# Altium footprint library lib_PCB.PcbLib: 392 footprints (part 18 of 25)
Each footprint in its own frame and in the unit in brackets; x right, y up, seen from the top. Pads: shape width x height; smd on the part's side, far side on the other; paste and mask are expansions set on the pad; w line width, h text height; cw(c..) or ccw(c..) is an arc to the next point about the centre after c.
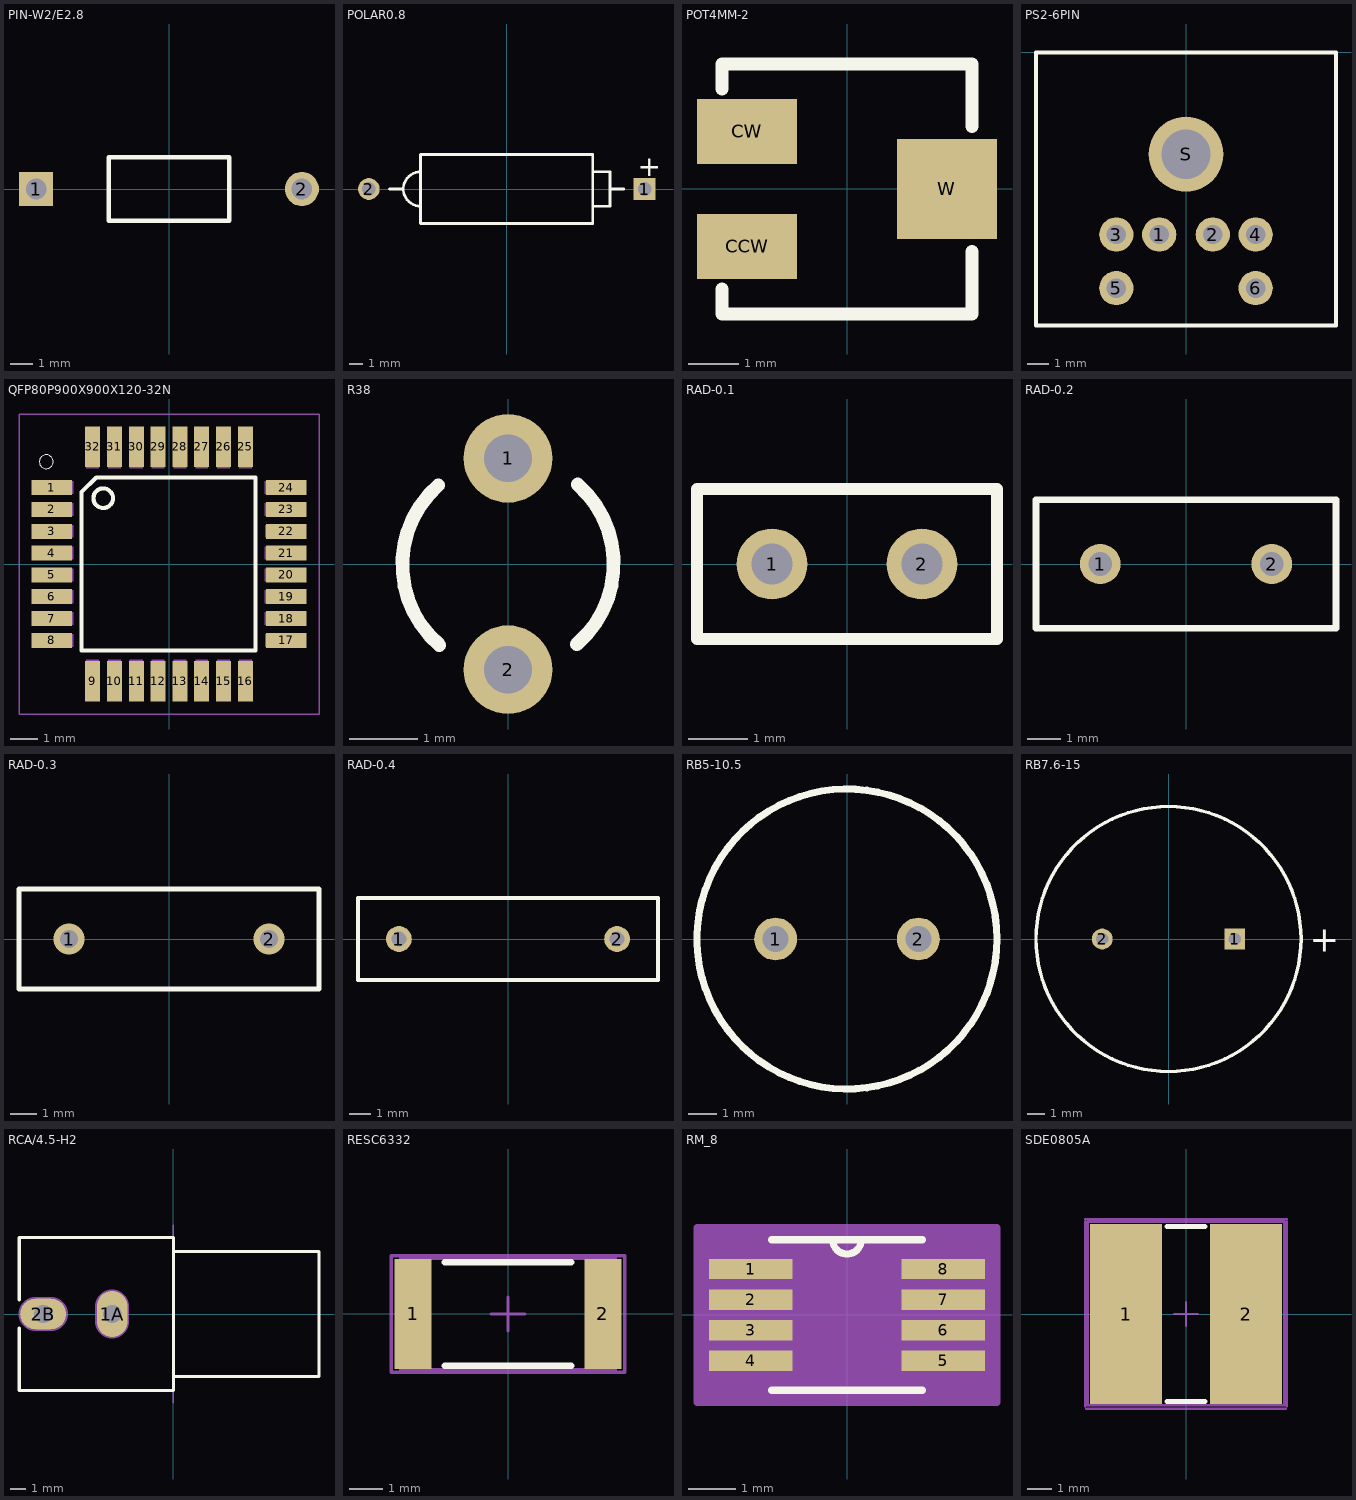
[diagram p17: the footprints below, top view; thin cyan lines are the x and y axes]

## PIN-W2/E2.8 [mm] "Thru-Hole; 2 Leads"
pads (2):
  rect 1.5x1.5 hole 0.9: 1(-5.825,0)
  round 1.5 hole 0.9: 2(5.825,0)
Top Overlay:
  lines w0.2: -2.65,-1.4 -2.65,1.4 2.65,1.4 2.65,-1.4 -2.65,-1.4

## POLAR0.8 [mm] "Polarized Capacitor; 2 Leads"
height 5.08
pads (2):
  rect 1.6x1.6 hole 1: 1(10.16,0)
  round 1.6 hole 1: 2(-10.16,0)
Top Overlay:
  lines w0.2: -8.636,0 -7.62,0 ; -6.35,-1.27 cw(c-6.35,0) -6.35,1.27 ; 6.35,-1.27 7.62,-1.27 7.62,1.27 6.35,1.27 ; 7.62,0 8.636,0 ; -6.35,-2.54 6.35,-2.54 6.35,2.54 -6.35,2.54 -6.35,-2.54
  text "+" at 9.652,0.95 h1.5

## POT4MM-2 [mm] "Square Trimming Potentiometer"
pads (3):
  rect 2x1.3 smd: CCW(-2,-1.15) CW(-2,1.15)
  rect 2x2 smd: W(2,0)
Top Overlay:
  lines w0.254: -2.5,-2 -2.5,-2.5 2.5,-2.5 2.5,-1.25 ; -2.5,2 -2.5,2.5 2.5,2.5 2.5,1.25

## PS2-6PIN [mm] "PS2 Socket, 6 Pin, Through Hole"
pads (7):
  round 1.6 hole 0.9: 1(-1.25,-8.5) 2(1.25,-8.5) 3(-3.25,-8.5) 4(3.25,-8.5) 5(-3.25,-11) 6(3.25,-11)
  round 3.5 hole 2.3: S(0,-4.75)
Top Overlay:
  lines w0.2: -7,-12.75 7,-12.75 7,0 -7,0 -7,-12.75

## QFP80P900X900X120-32N [mm]
pads (32):
  rect 1.5x0.55 smd: 1(-4.3,2.8) 2(-4.3,2) 3(-4.3,1.2) 4(-4.3,0.4) 5(-4.3,-0.4) 6(-4.3,-1.2) 7(-4.3,-2) 8(-4.3,-2.8) 17(4.3,-2.8) 18(4.3,-2) 19(4.3,-1.2) 20(4.3,-0.4) 21(4.3,0.4) 22(4.3,1.2) 23(4.3,2) 24(4.3,2.8)
  rect 0.55x1.5 smd: 9(-2.8,-4.3) 10(-2,-4.3) 11(-1.2,-4.3) 12(-0.4,-4.3) 13(0.4,-4.3) 14(1.2,-4.3) 15(2,-4.3) 16(2.8,-4.3) 25(2.8,4.3) 26(2,4.3) 27(1.2,4.3) 28(0.4,4.3) 29(-0.4,4.3) 30(-1.2,4.3) 31(-2,4.3) 32(-2.8,4.3)
Top Overlay:
  circle w0: c-4.5,3.75 r0.254
  circle w0.152: c-2.413,2.413 r0.359
  lines w0.152: -3.204,-3.175 3.175,-3.175 3.175,3.175 -2.667,3.175 -3.204,2.638 -3.204,-3.175
Mechanical 1:
  region: -3.039,4.497 -2.571,4.497 -2.571,3.518 -3.039,3.518
  region: -2.233,4.497 -1.771,4.497 -1.771,3.513 -2.233,3.513
  region: -1.432,4.497 -0.971,4.497 -0.971,3.513 -1.432,3.513
  region: -0.631,4.497 -0.171,4.497 -0.171,3.517 -0.631,3.517
  region: 0.172,4.497 0.629,4.497 0.629,3.515 0.172,3.515
  region: 0.975,4.497 1.429,4.497 1.429,3.518 0.975,3.518
  region: 1.777,4.497 2.229,4.497 2.229,3.517 1.777,3.517
  region: 2.578,4.497 3.029,4.497 3.029,3.515 2.578,3.515
  region: 3.517,3.029 4.497,3.029 4.497,2.58 3.517,2.58
  region: 3.513,2.229 4.497,2.229 4.497,1.775 3.513,1.775
  region: 3.523,1.429 4.497,1.429 4.497,0.976 3.523,0.976
  region: 3.514,0.629 4.497,0.629 4.497,0.172 3.514,0.172
  region: 3.516,-0.171 4.497,-0.171 4.497,-0.63 3.516,-0.63
  region: 3.517,-0.971 4.497,-0.971 4.497,-1.433 3.517,-1.433
  region: 3.512,-1.771 4.497,-1.771 4.497,-2.232 3.512,-2.232
  region: 3.52,-2.571 4.497,-2.571 4.497,-3.041 3.52,-3.041
  region: 2.584,-3.506 3.029,-3.506 3.029,-4.518 2.584,-4.518
  region: 1.776,-3.506 2.229,-3.506 2.229,-4.509 1.776,-4.509
  region: 0.974,-3.506 1.429,-3.506 1.429,-4.51 0.974,-4.51
  region: 0.172,-3.506 0.629,-3.506 0.629,-4.508 0.172,-4.508
  region: -0.63,-3.506 -0.171,-3.506 -0.171,-4.508 -0.63,-4.508
  region: -1.432,-3.506 -0.971,-3.506 -0.971,-4.509 -1.432,-4.509
  region: -2.234,-3.506 -1.771,-3.506 -1.771,-4.508 -2.234,-4.508
  region: -3.039,-3.506 -2.571,-3.506 -2.571,-4.512 -3.039,-4.512
  region: -4.514,-2.571 -3.506,-2.571 -3.506,-3.04 -4.514,-3.04
  region: -4.508,-1.771 -3.506,-1.771 -3.506,-2.234 -4.508,-2.234
  region: -4.508,-0.971 -3.506,-0.971 -3.506,-1.432 -4.508,-1.432
  region: -4.519,-0.171 -3.506,-0.171 -3.506,-0.632 -4.519,-0.632
  region: -4.518,0.629 -3.506,0.629 -3.506,0.172 -4.518,0.172
  region: -4.508,1.429 -3.506,1.429 -3.506,0.974 -4.508,0.974
  region: -4.509,2.229 -3.506,2.229 -3.506,1.776 -4.509,1.776
  region: -4.509,3.029 -3.506,3.029 -3.506,2.578 -4.509,2.578
  lines w0.05: -5.5,-5.5 -5.5,5.5 5.5,5.5 5.5,-5.5 -5.5,-5.5
3D body "TQFP 32.stp": height 1.2, standoff 0, extent -4.555,-4.555 4.445,4.445

## R38 [mm] "Crystal, Thru-Hole; 2 Leads; Body 3.1 x 8.2 mm (Dia.xH)"
height 8.2
pads (2):
  round 1.3 hole 0.7: 1(0,1.55) 2(0,-1.55)
Top Overlay:
  lines w0.2: -1.022,1.155 ccw(c0,-0.01) -1.006,-1.189 ; 1.006,-1.179 ccw(c0,0) 1.022,1.165

## RAD-0.1 [mm] "Radial Cap, Thru-Hole; 2 Leads; 0.1 in Pin Spacing"
pads (2):
  round 1.2 hole 0.7: 1(-1.27,0) 2(1.27,0)
Top Overlay:
  lines w0.2: -2.54,-1.27 -2.54,1.27 2.54,1.27 2.54,-1.27 -2.54,-1.27

## RAD-0.2 [mm] "Radial Cap, Thru-Hole; 2 Leads; 0.2 in Pin Spacing"
pads (2):
  round 1.2 hole 0.7: 1(-2.54,0) 2(2.54,0)
Top Overlay:
  lines w0.2: -4.445,-1.905 -4.445,1.905 4.445,1.905 4.445,-1.905 -4.445,-1.905

## RAD-0.3 [mm] "Radial Cap, Thru-Hole; 2 Leads; 0.3 in Pin Spacing"
height 6
pads (2):
  round 1.2 hole 0.7: 1(-3.81,0) 2(3.81,0)
Top Overlay:
  lines w0.2: -5.715,-1.905 -5.715,1.905 5.715,1.905 5.715,-1.905 -5.715,-1.905

## RAD-0.4 [mm] "Radial Cap, Thru-Hole; 2 Leads; 0.4 in Pin Spacing"
pads (2):
  round 1.2 hole 0.7: 1(-5.08,0) 2(5.08,0)
Top Overlay:
  lines w0.2: -6.985,-1.905 6.985,-1.905 6.985,1.905 -6.985,1.905 -6.985,-1.905

## RB5-10.5 [mm] "Capacitor (Radial); 2 Leads"
pads (2):
  round 1.5 hole 0.9: 1(-2.5,0) 2(2.5,0)
Top Overlay:
  circle w0.25: c0,0 r5.25
Mechanical 1:
  circle w0.02: c0,0 r5.25

## RB7.6-15 [mm] "Polarized Capacitor (Radial); 2 Leads"
pads (2):
  rect 1.2x1.2 hole 0.7: 1(3.81,0)
  round 1.2 hole 0.7: 2(-3.81,0)
Top Overlay:
  circle w0.2: c0,0 r7.62
  text "+" at 8.132,-0.737 h1.5

## RCA/4.5-H2 [mm] "Two Conductor Jack (RCA), Right Angle, Thru-Hole, Body 10 x 10 x 13 mm (WxTxH)"
height 13
pads (2):
  oval 2x3 hole 1.2: 1A(-4,0)
  oval 3x2 hole 1.2: 2B(-8.496,0)
Top Overlay:
  lines w0.2: -10.075,5 -0.018,5 ; -10.057,-0.92 -10.057,-5 0,-5 0,5 ; -10.057,0.92 -10.057,5 ; 0,-4.065 9.5,-4.065 9.5,4.065 0,4.065
Mechanical 1:
  lines w0.1: 0,-5.8 0,5.8
  lines w1.2: -8.996,0 -7.996,0 ; -4,-0.5 -4,0.5
  text "PCB Edge" at -0.333,-4.618 h0.25
  text "Alert PCB fab to slot details" at -10.057,7.842 h0.3
  text "Slot 1.2x2.2mm, PTH" at -10.057,7.342 h0.3
  text "Assign keep-out area to slot" at -10.057,8.342 h0.3
  text "Mech 1 - Slot cut-out" at -10.057,6.842 h0.3
  text "Mech 2 - Clearance, move to internal plane if present" at -10.057,6.342 h0.3
Mechanical 2:
  lines w2.216: -8.996,0 -7.996,0 ; -4,-0.5 -4,0.5

## RESC6332 [mm] "Chip Resistor, Body 6.3x3.2mm, IPC High Density"
height 0.9
pads (2):
  rect 1.1x3.3 smd: 1(-2.85,0) 2(2.85,0)
Top Overlay:
  lines w0.2: -1.9,-1.55 1.9,-1.55 ; -1.9,1.55 1.9,1.55
Mechanical 13:
  lines w0.1: -3.225,-1.675 -3.225,1.675 3.225,1.675 3.225,-1.675 -3.225,-1.675
Mechanical 15:
  lines w0.1: -0.5,0 0.5,0 ; 0,-0.5 0,0.5 ; -3.5,-1.75 -3.5,1.75 3.5,1.75 3.5,-1.75 -3.5,-1.75
3D body: height 0.9, standoff 0, extent -3.225,-1.675 3.225,1.675

## RM_8 [mil]
pads (8):
  rect 70x17 smd: 1(-80.5,38.39) 2(-80.5,12.8) 3(-80.5,-12.8) 4(-80.5,-38.39) 5(80.5,-38.39) 6(80.5,-12.8) 7(80.5,12.8) 8(80.5,38.39)
Top Overlay:
  lines w6: -63,-63 63,-63 ; -63,63 63,63 ; -12,63 ccw(c0,63) 12,63
Mechanical 13:
  lines w0: -12,63 ccw(c0,63) 12,63
Mechanical 15:
  region: 125.5,-73 -125.5,-73 -125.5,73 125.5,73
  lines w6: -125.5,-73 -125.5,73 125.5,73 125.5,-73 -125.5,-73
3D body "RM_8.stp": height 43.1, standoff 0, extent -101.5,-63 101.5,63

## SDE0805A [mm] "SMT Inductor"
height 4
pads (2):
  rect 3x7.5 smd: 1(-2.5,0) 2(2.5,0)
Top Overlay:
  lines w0.2: -0.8,-3.65 0.8,-3.65 ; -0.8,3.65 0.8,3.65
Mechanical 13:
  lines w0.1: -4.1,3.8 -4.1,-3.8 4.1,-3.8 4.1,3.8 ; -4.1,3.85 4.1,3.85
Mechanical 15:
  lines w0.1: -4.2,-3.85 -4.2,3.85 ; -4.2,3.95 4.2,3.95 ; -4.15,-3.95 4.15,-3.95 ; -0.5,0 0.5,0 ; 0,-0.5 0,0.5 ; 4.2,-3.85 4.2,3.85
3D body "SDE0805A.STP": height 5, standoff 0, extent -3.826,-3.563 3.826,3.437